# Altium integrated library My_LIB.IntLib: 372 symbols (part 2 of 3) (continued)
## PS2-6PIN (continued)
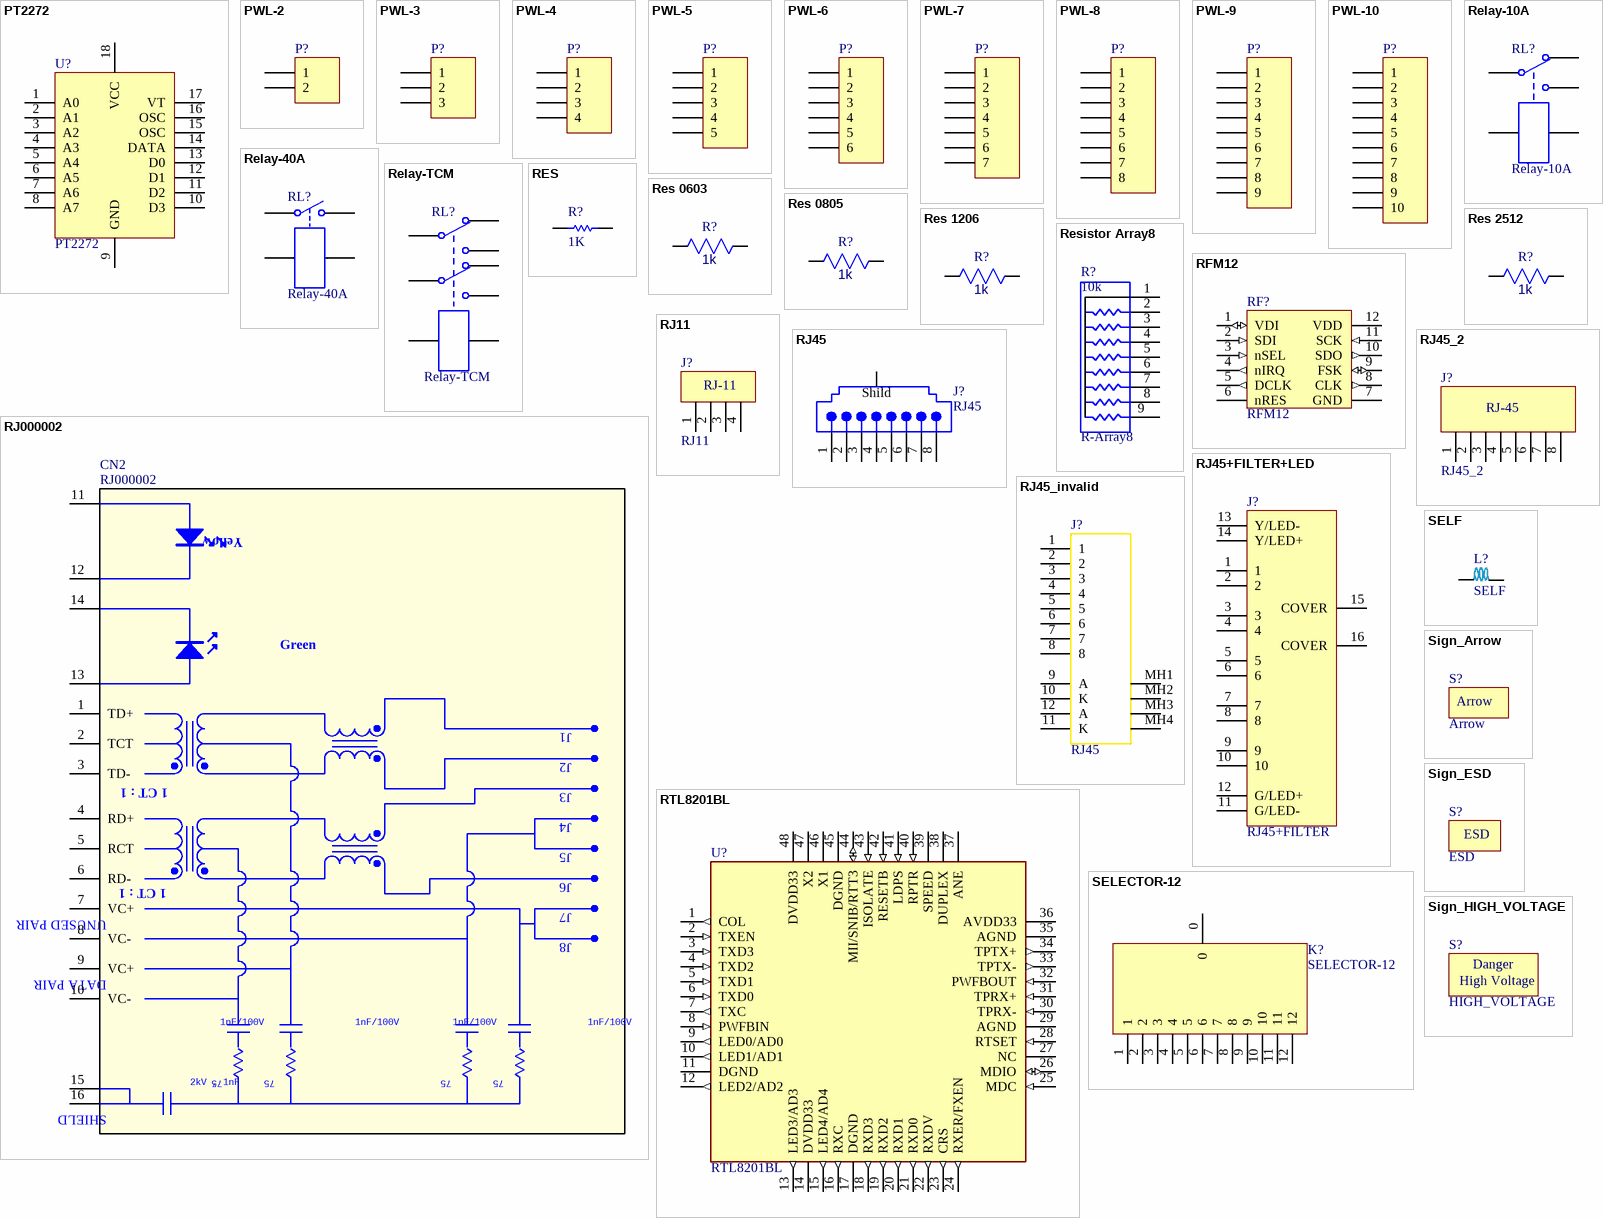
[diagram p9: symbols PT2272 to Sign_HIGH_VOLTAGE]

## PT2272
designator U?
footprint DIP-18
pins: 1 A0, 2 A1, 3 A2, 4 A3, 5 A4, 6 A5, 7 A6, 8 A7, 9 GND, 10 D3, 11 D2, 12 D1, 13 D0, 14 DATA, 15 OSC, 16 OSC, 17 VT, 18 VCC

## PWL-2
designator P?  (value not drawn)
Power Terminal 2pin,Header, 2-Pin; LatestRevisionDate: 17-Jul-2002; LatestRevisionNote: Re-released for DXP Platform.; Publisher: Altium Limited
footprint PWL-2 (Connector; Header; 2 Position)
pins: 1, 2

## PWL-3
designator P?  (value not drawn)
Power Terminal 3pin,Header, 3-Pin; LatestRevisionDate: 17-Jul-2002; LatestRevisionNote: Re-released for DXP Platform.; Publisher: Altium Limited
footprint PWL-3 (Connector; Header; 3 Position)
pins: 1, 2, 3

## PWL-4
designator P?  (value not drawn)
Power Terminal 4pin,Header, 4-Pin; LatestRevisionDate: 17-Jul-2002; LatestRevisionNote: Re-released for DXP Platform.; Publisher: Altium Limited
footprint PWL-4 (Connector; Header; 4 Position)
pins: 1, 2, 3, 4

## PWL-5
designator P?  (value not drawn)
Power Terminal 5pin,Header, 5-Pin; LatestRevisionDate: 17-Jul-2002; LatestRevisionNote: Re-released for DXP Platform.; Publisher: Altium Limited
footprint PWL-5 (Connector; Header; 5 Position)
pins: 1, 2, 3, 4, 5

## PWL-6
designator P?  (value not drawn)
Power Terminal 6pin,Header, 6-Pin; LatestRevisionDate: 17-Jul-2002; LatestRevisionNote: Re-released for DXP Platform.; Publisher: Altium Limited
footprint PWL-6 (Connector; Header; 6 Position)
pins: 1, 2, 3, 4, 5, 6

## PWL-7
designator P?  (value not drawn)
Power Terminal 7pin,Header, 7-Pin; LatestRevisionDate: 17-Jul-2002; LatestRevisionNote: Re-released for DXP Platform.; Publisher: Altium Limited
footprint PWL-7 (Connector; Header; 7 Position)
pins: 1, 2, 3, 4, 5, 6, 7

## PWL-8
designator P?  (value not drawn)
Power Terminal 8pin,Header, 8-Pin; LatestRevisionDate: 17-Jul-2002; LatestRevisionNote: Re-released for DXP Platform.; Publisher: Altium Limited
footprint PWL-8 (Connector; Header; 8 Position)
pins: 1, 2, 3, 4, 5, 6, 7, 8

## PWL-9
designator P?  (value not drawn)
Power Terminal 9pin,Header, 9-Pin; LatestRevisionDate: 17-Jul-2002; LatestRevisionNote: Re-released for DXP Platform.; Publisher: Altium Limited
footprint PWL-9 (Connector; Header; 9 Position)
pins: 1, 2, 3, 4, 5, 6, 7, 8, 9

## PWL-10
designator P?  (value not drawn)
Power Terminal 10pin,Header, 10-Pin; LatestRevisionDate: 17-Jul-2002; LatestRevisionNote: Re-released for DXP Platform.; Publisher: Altium Limited
footprint PWL-10 (Connector; Header; 10 Position)
pins: 1, 2, 3, 4, 5, 6, 7, 8, 9, 10

## Relay-10A
designator RL?
footprint Relay 10A
pins: 1 COM, 2 NO, 3 NC, 4 C1, 5 C2

## Relay-40A
designator RL?
footprint Relay 40A
pins: 2 C1, 3 COM, 5 NO, 6 C2

## Relay-TCM
designator RL?
footprint Relay-TCM
pins: 1 C1, 4 COM1, 6 NC1, 8 NO1, 9 NO2, 11 NC2, 13 COM2, 16 C2

## RES
designator R?, comment 1K
footprint Axial-0.4-0.25W
footprint Axial-0.5-0.5W
footprint Axial-0.6-1W
footprint Axial-0.8-2W
footprint Axial-1.3-5W
footprint Axial-2-10W
footprint AXIAL-2.75-15W
footprint AXIAL_5W
pins: 1, 2

## Res 0603
designator R?, comment 1k
Resistor
footprint R_0603
pins: 1, 2

## Res 0805
designator R?, comment 1k
Resistor
footprint R_0805 (Resistor Pattern)
pins: 1, 2

## Res 1206
designator R?, comment 1k
Resistor
footprint R_1206
pins: 1, 2

## Res 2512
designator R?, comment 1k
Resistor
footprint R2512
pins: 1, 2

## Resistor Array8
designator R?, comment R-Array8  value 10k
Array Resistor-Include 8 RES; Designer: M.Amani; LastRevisionDate: 2007; PackageReference: ResArray-8; Publisher: Kosha Electronic Limited; PublisherLinkURL: http://www.koshanic.com
footprint Res Array-8
pins: 1, 2, 3, 4, 5, 6, 7, 8, 9

## RFM12
designator RF?
Universal ISM Band FSK Transceiver Module
footprint RFM12
pins: 1 VDI (io), 2 SDI (in), 3 nSEL (in), 4 nIRQ (out), 5 DCLK (out), 6 nRES, 7 GND (power), 8 CLK (out), 9 FSK (io), 10 SDO (out), 11 SCK (in), 12 VDD (power)

## RJ000002
designator CN2
10/100 Magnetic RJ45; Manufacturer: YCL
footprint RJ45-J000002 (Lan)
pins: 1 TD+, 2 TCT, 3 TD-, 4 RD+, 5 RCT, 6 RD-, 7 VC+, 8 VC-, 9 VC+, 10 VC-, 11 P11, 12 P12, 13 P13, 14 P14, 15 P15, 16 P16
text: Yellow; Green; J1; J2; 1 CT : 1; J3; J4; J5; J6; J7; UNUSED PAIR; J8; DATA PAIR; 1nF/100V; 75; 2kV , 1nF; SHIELD

## RJ11
designator J?
footprint RJ11
pins: 1, 2, 3, 4
text: RJ-11

## RJ45
designator J?
Right Angle, Standard Profile, RJ45-Keyed, Flange Mount PCB Jack; Ports: 1; Positions/Loaded: Port1 - 8 Keyed/8; PerformanceCategory: 3; PCB_Mounting: Thru-Hole; ComponentAvailability: Obsolete; DrillSize: Nominal, Rounded to nearest 0.05mm; PCB_Layout: Complies with Manufacturer's Recommendation.; Published: 25-Jun-2002; DatasheetDocument: 18-Dec-2001; PackageDocument: 18-Dec-2001; PackageReference: 15-43-6233; Publisher: Altium Limited; ComponentLink1Description: Manufacturer Link; ComponentLink1URL: http://www.molex.com/; ComponentLink2Description: Datasheet; ComponentLink2URL: http://www.molex.com/cmc_upload/common_files/1212003_catalogmx41314.pdf; ComponentLink3Description: Iges Model; ComponentLink3URL: http://www.molex.com/pdm_docs/igs/15-43-6233_igs.zip
footprint RJ45
pins: 1, 2, 3, 4, 5, 6, 7, 8, shild Shild

## RJ45+FILTER+LED
designator J?, comment RJ45+FILTER
footprint RJ45+FILTER
pins: 1, 2, 3, 4, 5, 6, 7, 8, 9, 10, 11 G/LED-, 12 G/LED+, 13 Y/LED-, 14 Y/LED+, 15 COVER, 16 COVER

## RJ45_2
designator J?
footprint RJ45
pins: 1, 2, 3, 4, 5, 6, 7, 8
text: RJ-45

## RJ45_invalid
designator J?, comment RJ45
footprint RJ45-invalid
footprint RJ45_invalid1
pins: 1, 2, 3, 4, 5, 6, 7, 8, 9 A, 10 K, 11 K, 12 A, MH1, MH2, MH3, MH4

## RTL8201BL
designator U?
SINGLE PORT 10/100M  FAST ETHERNET PHYCEIVER
footprint LQFP48_M (Thin QFP, 48-Leads, Body 7x7mm, Pitch 0.5mm, IPC Low Density)
pins: 1 COL (out), 2 TXEN (in), 3 TXD3 (in), 4 TXD2 (in), 5 TXD1 (in), 6 TXD0 (in), 7 TXC (out), 8 PWFBIN (in), 9 LED0/AD0 (out), 10 LED1/AD1 (out), 11 DGND (power), 12 LED2/AD2 (out), 13 LED3/AD3 (out), 14 DVDD33 (power), 15 LED4/AD4 (out), 16 RXC (out), 17 DGND (power), 18 RXD3 (out), 19 RXD2 (out), 20 RXD1 (out), 21 RXD0 (out), 22 RXDV (out), 23 CRS (out), 24 RXER/FXEN (out), 25 MDC (in), 26 MDIO (io), 27 NC (power), 28 RTSET (in), 29 AGND (power), 30 TPRX- (in), 31 TPRX+ (in), 32 PWFBOUT (in), 33 TPTX- (out), 34 TPTX+ (out), 35 AGND (power), 36 AVDD33 (power), 37 ANE (power), 38 DUPLEX (power), 39 SPEED (power), 40 RPTR (in), 41 LDPS (in), 42 RESETB (in), 43 ISOLATE (in), 44 MII/SNIB/RTT3 (io), 45 DGND (power), 46 X1, 47 X2, 48 DVDD33 (power)

## SELECTOR-12
designator K?
footprint SELECTOR_12
pins: 0, 1, 2, 3, 4, 5, 6, 7, 8, 9, 10, 11, 12

## SELF
designator L?
footprint SELF_1
footprint SELF_2
footprint SELF_3
pins: 1, 2

## Sign_Arrow
designator S?, comment Arrow
footprint Arrow

## Sign_ESD
designator S?, comment ESD
footprint ESD

## Sign_HIGH_VOLTAGE
designator S?, comment HIGH_VOLTAGE
footprint HIGH VOLTAGE
text: Danger; High Voltage

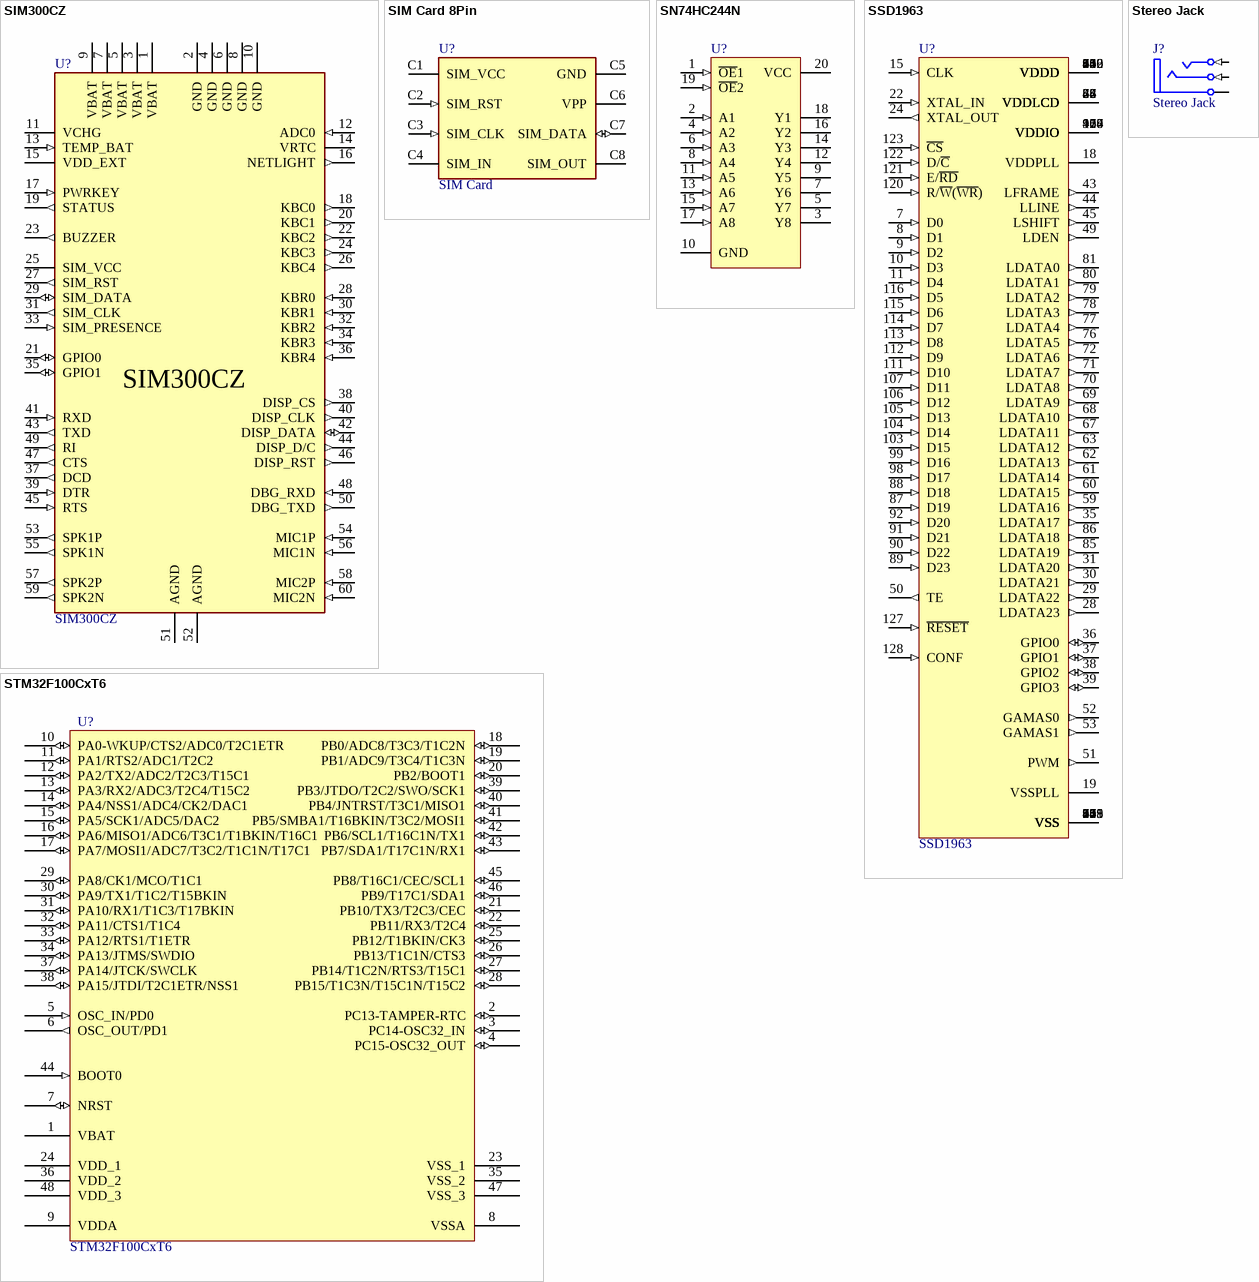
[diagram p10: symbols SIM300CZ to STM32F100CxT6]

## SIM300CZ
designator U?
footprint SIM300
pins: 1 VBAT (power), 2 GND (power), 3 VBAT (power), 4 GND (power), 5 VBAT (power), 6 GND (power), 7 VBAT (power), 8 GND (power), 9 VBAT (power), 10 GND (power), 11 VCHG (power), 12 ADC0 (in), 13 TEMP_BAT (in), 14 VRTC, 15 VDD_EXT, 16 NETLIGHT (out), 17 PWRKEY (in), 18 KBC0 (out), 19 STATUS (out), 20 KBC1 (out), 21 GPIO0 (io), 22 KBC2 (out), 23 BUZZER (out), 24 KBC3 (out), 25 SIM_VCC (power), 26 KBC4 (out), 27 SIM_RST (out), 28 KBR0 (in), 29 SIM_DATA (io), 30 KBR1 (in), 31 SIM_CLK (out), 32 KBR2 (in), 33 SIM_PRESENCE (in), 34 KBR3 (in), 35 GPIO1 (io), 36 KBR4 (in), 37 DCD (out), 38 DISP_CS (out), 39 DTR (in), 40 DISP_CLK (out), 41 RXD (in), 42 DISP_DATA (io), 43 TXD (out), 44 DISP_D/C (out), 45 RTS (in), 46 DISP_RST (out), 47 CTS (out), 48 DBG_RXD (in), 49 RI (out), 50 DBG_TXD (out), 51 AGND (power), 52 AGND (power), 53 SPK1P (out), 54 MIC1P (in), 55 SPK1N (out), 56 MIC1N (in), 57 SPK2P (out), 58 MIC2P (in), 59 SPK2N (out), 60 MIC2N (in)

## SIM Card 8Pin
designator U?, comment SIM Card
footprint SIMCARD-8pin
pins: C1 SIM_VCC (power), C2 SIM_RST (in), C3 SIM_CLK (in), C4 SIM_IN, C5 GND (power), C6 VPP, C7 SIM_DATA (io), C8 SIM_OUT

## SN74HC244N
designator U?
Octal Buffer and Line Driver with 3-State Outputs; Published: 8-Jun-2000; LatestRevisionDate: 06-Jun-2005; LatestRevisionNote: Stylized 3D Model Added.; DatasheetVersion: May-1997; PackageVersion: Oct-1995; PackageReference: N020; Publisher: Altium Limited; PackageDescription: DIP; 20 Leads; Row Spacing 7.62 mm; Pitch 2.54 mm; ComponentLink1Description: Manufacturer Link; ComponentLink1URL: http://www.ti.com/; ComponentLink2Description: Datasheet; ComponentLink2URL: http://www-s.ti.com/sc/ds/sn74hc244.pdf
footprint DIP-20
pins: 1 ~{OE}1 (in), 2 A1 (in), 3 Y8 (hiz), 4 A2 (in), 5 Y7 (hiz), 6 A3 (in), 7 Y6 (hiz), 8 A4 (in), 9 Y5 (hiz), 10 GND (power), 11 A5 (in), 12 Y4 (hiz), 13 A6 (in), 14 Y3 (hiz), 15 A7 (in), 16 Y2 (hiz), 17 A8 (in), 18 Y1 (hiz), 19 ~{OE}2 (in), 20 VCC (power)

## SSD1963
designator U?
footprint LQFP128 (Thin QFP, 128Leads, Body 14x14mm, Pitch 0.4mm, IPC Low Density)
pins: 1 VDDD, 2 VSS "Ground", 3 VSS "Ground", 4 VDDIO "MCU IO Power Supply", 5 VSS "Ground", 6 VDDD, 7 D0 (in) "MCU Data", 8 D1 (in) "MCU Data", 9 D2 (in) "MCU Data", 10 D3 (in) "MCU Data", 11 D4 (in) "MCU Data", 12 VDDIO "MCU IO Power Supply", 13 VSS "Ground", 14 VDDD, 15 CLK (in) "TTL Clock input", 16 VDDIO "MCU IO Power Supply", 17 VSS "Ground", 18 VDDPLL "Analog supply voltage", 19 VSSPLL "Analog ground", 20 VSS "Ground", 21 VDDD, 22 XTAL_IN (in) "Crystal oscillator input", 23 VSS "Ground", 24 XTAL_OUT (out) "Crystal oscillator output", 25 VDDD, 26 VSS "Ground", 27 VDDLCD "LCD IO Power Supply", 28 LDATA23 (out) "RGB Data", 29 LDATA22 (out) "RGB Data", 30 LDATA21 (out) "RGB Data", 31 LDATA20 (out) "RGB Data", 32 VDDD, 33 VSS "Ground", 34 VDDLCD "LCD IO Power Supply", 35 LDATA17 (out) "RGB Data", 36 GPIO0 (io) "GPIO", 37 GPIO1 (io) "GPIO", 38 GPIO2 (io) "GPIO", 39 GPIO3 (io) "GPIO", 40 VDDD, 41 VSS "Ground", 42 VDDLCD "LCD IO Power Supply", 43 LFRAME (out) "Vertical Sync", 44 LLINE (out) "Horizontal Sync", 45 LSHIFT (out) "Pixel Clock", 46 VDDD, 47 VSS "Ground", 48 VDDLCD "LCD IO Power Supply", 49 LDEN (out) "Data Valid", 50 TE (out) "Tearing effect", 51 PWM (out) "Backlight PWM Signal", 52 GAMAS0 (out) "Gamma Selection for panel", 53 GAMAS1 (out) "Gamma Selection for panel", 54 VDDLCD "LCD IO Power Supply", 55 VSS "Ground", 56 VDDD, 57 VSS "Ground", 58 VDDLCD "LCD IO Power Supply", 59 LDATA16 (out) "RGB Data", 60 LDATA15 (out) "RGB Data", 61 LDATA14 (out) "RGB Data", 62 LDATA13 (out) "RGB Data", 63 LDATA12 (out) "RGB Data", 64 VDDD, 65 VSS "Ground", 66 VDDLCD "LCD IO Power Supply", 67 LDATA11 (out) "RGB Data", 68 LDATA10 (out) "RGB Data", 69 LDATA9 (out) "RGB Data", 70 LDATA8 (out) "RGB Data", 71 LDATA7 (out) "RGB Data", 72 LDATA6 (out) "RGB Data", 73 VDDD, 74 VSS "Ground", 75 VDDLCD "LCD IO Power Supply", 76 LDATA5 (out) "RGB Data", 77 LDATA4 (out) "RGB Data", 78 LDATA3 (out) "RGB Data", 79 LDATA2 (out) "RGB Data", 80 LDATA1 (out) "RGB Data", 81 LDATA0 (out) "RGB Data", 82 VDDD, 83 VSS "Ground", 84 VDDLCD "LCD IO Power Supply", 85 LDATA19 (out) "RGB Data", 86 LDATA18 (out) "RGB Data", 87 D19 (in) "MCU Data", 88 D18 (in) "MCU Data", 89 D23 (in) "MCU Data", 90 D22 (in) "MCU Data", 91 D21 (in) "MCU Data", 92 D20 (in) "MCU Data", 93 VDDD, 94 VSS "Ground", 95 VDDIO "MCU IO Power Supply", 96 VSS "Ground", 97 VDDIO "MCU IO Power Supply", 98 D17 (in) "MCU Data", 99 D16 (in) "MCU Data", 100 VDDIO "MCU IO Power Supply", 101 VSS "Ground", 102 VDDD, 103 D15 (in) "MCU Data", 104 D14 (in) "MCU Data", 105 D13 (in) "MCU Data", 106 D12 (in) "MCU Data", 107 D11 (in) "MCU Data", 108 VDDIO "MCU IO Power Supply", 109 VSS "Ground", 110 VDDD, 111 D10 (in) "MCU Data", 112 D9 (in) "MCU Data", 113 D8 (in) "MCU Data", 114 D7 (in) "MCU Data", 115 D6 (in) "MCU Data", 116 D5 (in) "MCU Data", 117 VDDIO "MCU IO Power Supply", 118 VSS "Ground", 119 VDDD, 120 R/~{W}(~{WR}) (in) "Read/Write/Write strobe", 121 E/~{RD} (in) "Enable/Read strobe signal", 122 D/~{C} (in) "Data/Command select", 123 ~{CS} (in) "Chip select", 124 VDDIO "MCU IO Power Supply", 125 VSS "Ground", 126 VDDD, 127 ~{RESET} (in) "Master reset", 128 CONF (in) "MCU Configuration"

## Stereo Jack
designator J?
Jack Socket, 1/4" [6.5mm], Thru-Hole, Vertical, 3-Conductor Open Circuit (Non-Normalling); PackageDocument: 2003; PCB_Layout: Complies with manufacturer's recommendation.; DrillAndSlotSize: Corresponds to nominal value.; Published: 15-Jul-2004; LatestRevisionDate: 15-Jul-2004; LatestRevisionNote: Component Replaced.; DatasheetDocument: 2003; PackageReference: S1VS_SSS; Publisher: Altium Limited; ComponentLink1Description: Manufacturer Link; ComponentLink1URL: http://www.cliffuk.co.uk/
footprint Stereo Jack
footprint Stereo Jack2
pins: 2 L (in) "Tip/Left Channel/(+)", 4 R (in) "Ring/Right Channel/(-)", 5 G (power) "Sleeve (Ground)"

## STM32F100CxT6
designator U?
STM32 ARM-based 32-bit MCU with 32 Kbytes Flash, 48-pin LQFP, Industrial Temperature; Published: 30-May-2008; DatasheetVersion: Mar-2010; PackageVersion: Mar-2008; PackageReference: LQFP48; Publisher: Altium Limited; PackageDescription: 48-Pin Low-Profile Quad Flat Pack, 7 x 7 mm Body, 0.5 mm Pitch (LQFP48); ComponentLink1Description: Manufacturer Link; ComponentLink1URL: www.st.com/stm32; ComponentLink2Description: Datasheet; ComponentLink2URL: http://www.st.com/stonline/products/literature/ds/13586.pdf
footprint LQFP48_N (Thin QFP, 48-Leads, Body 7x7mm, Pitch 0.5mm, IPC Medium Density)
footprint LQFP48_L (Thin QFP, 48-Leads, Body 7x7mm, Pitch 0.5mm, IPC High Density)
footprint LQFP48_M (Thin QFP, 48-Leads, Body 7x7mm, Pitch 0.5mm, IPC Low Density)
pins: 1 VBAT (power), 2 PC13-TAMPER-RTC (io), 3 PC14-OSC32_IN (io), 4 PC15-OSC32_OUT (io), 5 OSC_IN/PD0 (in), 6 OSC_OUT/PD1 (out), 7 NRST (io), 8 VSSA (power), 9 VDDA (power), 10 PA0-WKUP/CTS2/ADC0/T2C1ETR (io), 11 PA1/RTS2/ADC1/T2C2 (io), 12 PA2/TX2/ADC2/T2C3/T15C1 (io), 13 PA3/RX2/ADC3/T2C4/T15C2 (io), 14 PA4/NSS1/ADC4/CK2/DAC1 (io), 15 PA5/SCK1/ADC5/DAC2 (io), 16 PA6/MISO1/ADC6/T3C1/T1BKIN/T16C1 (io), 17 PA7/MOSI1/ADC7/T3C2/T1C1N/T17C1 (io), 18 PB0/ADC8/T3C3/T1C2N (io), 19 PB1/ADC9/T3C4/T1C3N (io), 20 PB2/BOOT1 (io), 21 PB10/TX3/T2C3/CEC (io), 22 PB11/RX3/T2C4 (io), 23 VSS_1 (power), 24 VDD_1 (power), 25 PB12/T1BKIN/CK3 (io), 26 PB13/T1C1N/CTS3 (io), 27 PB14/T1C2N/RTS3/T15C1 (io), 28 PB15/T1C3N/T15C1N/T15C2 (io), 29 PA8/CK1/MCO/T1C1 (io), 30 PA9/TX1/T1C2/T15BKIN (io), 31 PA10/RX1/T1C3/T17BKIN (io), 32 PA11/CTS1/T1C4 (io), 33 PA12/RTS1/T1ETR (io), 34 PA13/JTMS/SWDIO (io), 35 VSS_2 (power), 36 VDD_2 (power), 37 PA14/JTCK/SWCLK (io), 38 PA15/JTDI/T2C1ETR/NSS1 (io), 39 PB3/JTDO/T2C2/SWO/SCK1 (io), 40 PB4/JNTRST/T3C1/MISO1 (io), 41 PB5/SMBA1/T16BKIN/T3C2/MOSI1 (io), 42 PB6/SCL1/T16C1N/TX1 (io), 43 PB7/SDA1/T17C1N/RX1 (io), 44 BOOT0 (in), 45 PB8/T16C1/CEC/SCL1 (io), 46 PB9/T17C1/SDA1 (io), 47 VSS_3 (power), 48 VDD_3 (power)
